# Altium footprint library 3.10-变压器.PcbLib: 33 footprints (part 2 of 3)
Each footprint in its own frame and in the unit in brackets; x right, y up, seen from the top. Pads: shape width x height; smd on the part's side, far side on the other; paste and mask are expansions set on the pad; w line width, h text height; cw(c..) or ccw(c..) is an arc to the next point about the centre after c.
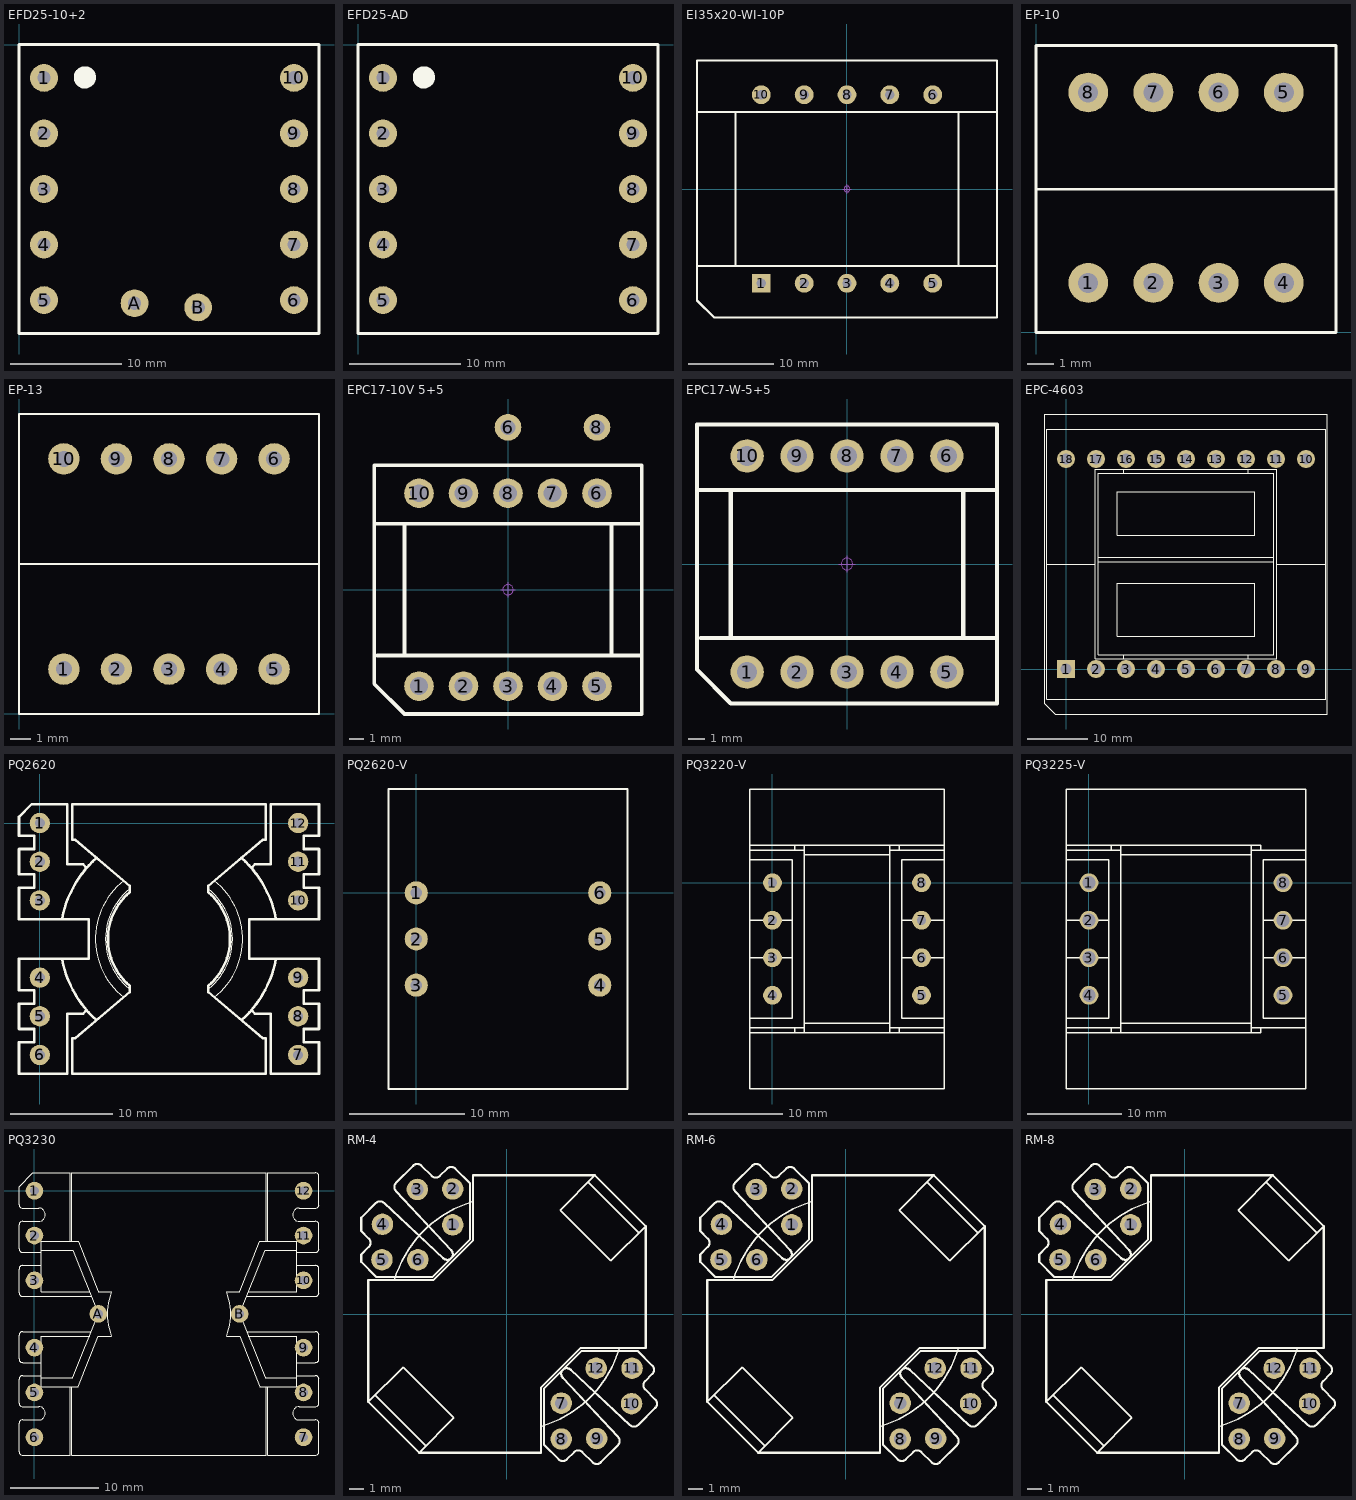
[diagram p1: the footprints below, top view; thin cyan lines are the x and y axes]

## EFD25-10+2 [mm]
pads (12):
  round 2.5 hole 1.2: 1(2.25,-3) 2(2.25,-8) 3(2.25,-13) 4(2.25,-18) 5(2.25,-23) 6(24.75,-23) 7(24.75,-18) 8(24.75,-13) 9(24.75,-8) 10(24.75,-3) A(10.4,-23.278) B(16.124,-23.66)
Top Overlay:
  circle w1: c5.927,-2.955 r0.5
  lines w0.3: 0,-26 0,0 27,0 27,-26 0,-26
3D body: height 12.9, standoff -3.5, extent 0.066,-26.59 26.934,0.59

## EFD25-AD [mm]
pads (10):
  round 2.5 hole 1.2: 1(2.25,-3) 2(2.25,-8) 3(2.25,-13) 4(2.25,-18) 5(2.25,-23) 6(24.75,-23) 7(24.75,-18) 8(24.75,-13) 9(24.75,-8) 10(24.75,-3)
Top Overlay:
  circle w1: c5.927,-2.955 r0.5
  lines w0.3: 0,-26 0,0 27,0 27,-26 0,-26
3D body: height 12.9, standoff -3.5, extent 0.066,-26.59 26.934,0.59

## EI35x20-WI-10P [mm] "长：35mm，宽：30mm，高：33mm  淘宝ID:黄晶宝石"
pads (10):
  rect 2.2x2.2 hole 1.1: 1(-10,-11)
  round 2.2 hole 1.1: 2(-5,-11) 3(0,-11) 4(5,-11) 5(10,-11) 6(10,11) 7(5,11) 8(0,11) 9(-5,11) 10(-10,11)
Top Overlay:
  lines w0.254: -17.5,-9 17.5,-9 ; -17.5,9 17.5,9 ; -13,-9 -13,9 ; 13,-9 13,9 ; -17.5,-13 -15.5,-15 17.5,-15 17.5,15 -17.5,15 -17.5,-13
Mechanical 15:
  circle w0.05: c0,0 r0.35
  lines w0.05: -0.5,0 0.5,0 ; 0,-0.5 0,0.5
3D body: height 33.55, standoff -2.95, extent -17.5,-15 17.5,15

## EP-10 [mil]
pads (8):
  round 60 hole 30: 1(78.74,74.8) 2(177.17,74.8) 3(275.59,74.8) 4(374.02,74.8) 5(374.02,362.2) 6(275.59,362.2) 7(177.17,362.2) 8(78.74,362.2)
Top Overlay:
  lines w3.94: 0,216.14 452.76,216.14 ; 0,0 452.76,0 452.76,433.07 0,433.07 0,0
3D body: height 441.63, standoff -160.73, extent 0,0 452.75,433.07

## EP-13 [mil] "淘宝ID:黄晶宝石   店铺网址:https://shop463601444.taobao.com"
pads (10):
  round 60 hole 30: 1(85.43,85.43) 2(185.43,85.43) 3(285.43,85.43) 4(385.43,85.43) 5(485.43,85.43) 6(485.43,485.43) 7(385.43,485.43) 8(285.43,485.43) 9(185.43,485.43) 10(85.43,485.43)
Top Overlay:
  lines w3.94: 0,285.43 570.87,285.43 ; 0,0 570.87,0 570.87,570.87 0,570.87 0,0
3D body: height 488.19, standoff -157.48, extent 29.49,29.49 541.38,541.38

## EPC17-10V 5+5 [mm] "磁芯17mm，高10mm，脚距3mm，  淘宝ID:黄晶宝石"
pads (12):
  round 2 hole 1.2: 1(-6,-6.5) 2(-3,-6.5) 3(0,-6.5) 4(3,-6.5) 5(6,-6.5) 6(6,6.5) 7(3,6.5) 8(0,6.5) 9(-3,6.5) 10(-6,6.5)
  round 1.8 hole 1: 6(0,10.945) 8(6,10.945)
Top Overlay:
  lines w0.254: -9.017,4.445 9.017,4.445 ; -8.794,-4.445 9.017,-4.445 ; -6.985,-4.445 -6.985,4.445 ; 6.985,-4.445 6.985,4.445 ; -9.017,-6.35 -6.985,-8.382 9.017,-8.382 9.017,8.382 -9.017,8.382 -9.017,-6.35
Mechanical 15:
  circle w0.05: c0,0 r0.35
  lines w0.05: -0.5,0 0.5,0 ; 0,-0.5 0,0.5
3D body: height 9.75, standoff -3.15, extent -8.75,-8.1 8.75,8.1

## EPC17-W-5+5 [mm] "磁芯17mm，高10mm，脚距3mm， 淘宝ID:黄晶宝石"
pads (10):
  round 2 hole 1.2: 1(-6,-6.5) 2(-3,-6.5) 3(0,-6.5) 4(3,-6.5) 5(6,-6.5) 6(6,6.5) 7(3,6.5) 8(0,6.5) 9(-3,6.5) 10(-6,6.5)
Top Overlay:
  lines w0.254: -9.017,4.445 9.017,4.445 ; -8.794,-4.445 9.017,-4.445 ; -6.985,-4.445 -6.985,4.445 ; 6.985,-4.445 6.985,4.445 ; -9.017,-6.35 -9.017,8.382 9.017,8.382 9.017,-8.382 -6.985,-8.382 -9.017,-6.35
Mechanical 15:
  circle w0.05: c0,0 r0.35
  lines w0.05: -0.5,0 0.5,0 ; 0,-0.5 0,0.5
3D body: height 9.75, standoff -3.15, extent -8.75,-8.1 8.75,8.1

## EPC-4603 [mm] "联系卖家 免费查找封装"
pads (18):
  rect 3x3 hole 1.8: 1(0,0)
  round 3 hole 1.8: 2(5,0) 3(10,0) 4(15,0) 5(20,0) 6(25,0) 7(30,0) 8(35,0) 9(40,0) 10(40,35) 11(35,35) 12(30,35) 13(25,35) 14(20,35) 15(15,35) 16(10,35) 17(5,35) 18(0,35)
Top Overlay:
  lines w0.1: 5.354,17.85 34.649,17.85 ; 5.354,18.65 34.649,18.65 ; 9.6,1.7 9.6,2.346 ; 9.6,32.654 9.6,33.3 ; 30.4,1.7 30.4,2.341 ; 30.4,32.659 30.4,33.3 ; -3.25,17.5 4.9,17.5 ; -3.25,17.5 -3.25,-5 43.25,-5 43.25,17.5 ; -3.25,17.5 -3.25,40 43.25,40 43.25,17.5 ; 4.9,17.5 4.9,1.7 35.1,1.7 35.1,17.5 ; 4.9,17.5 4.9,33.3 35.1,33.3 35.1,17.5 ; 35.1,17.5 43.25,17.5 ; -3.5,-5.819 -1.819,-7.5 43.5,-7.5 43.5,42.5 -3.5,42.5 -3.5,-5.819 ; 5.35,2.35 34.65,2.35 34.65,32.65 5.35,32.65 5.35,2.35 ; 8.5,5.5 31.5,5.5 31.5,14.25 8.5,14.25 8.5,5.5 ; 8.5,22.25 31.5,22.25 31.5,29.5 8.5,29.5 8.5,22.25
3D body: height 29.5, standoff -5, extent -3.5,-7.5 43.5,42.5

## PQ2620 [mm]
height 20.5
pads (12):
  round 2 hole 1: 1(0,0) 2(0,-3.8) 3(0,-7.6) 4(0,-15.2) 5(0,-19) 6(0,-22.8) 7(25.4,-22.8) 8(25.4,-19) 9(25.4,-15.2) 10(25.4,-7.6) 11(25.4,-3.8) 12(25.4,0)
Top Overlay:
  lines w0.1: 8.241,-17.117 cw(c12.7,-11.4) 8.249,-5.677 ; 8.838,-16.314 cw(c12.7,-11.4) 8.845,-6.48 ; 16.555,-6.48 cw(c12.7,-11.4) 16.562,-16.314 ; 17.151,-5.677 cw(c12.7,-11.4) 17.159,-17.117
  lines w0.254: 2.192,-13.418 ccw(c12.7,-11.4) 5.563,-19.372 ; 2.192,-9.382 cw(c12.7,-11.4) 5.578,-3.414 ; 4.609,-18.403 4.262,-18.75 2.7,-18.75 2.7,-24.65 -2.05,-24.65 -2.05,-21.55 -0.55,-21.55 -0.55,-20.25 -2.05,-20.25 -2.05,-17.75 -0.55,-17.75 -0.55,-16.45 -2.05,-16.45 -2.05,-13.35 4.8,-13.35 4.8,-9.45 -2.05,-9.45 -2.05,-6.35 -0.55,-6.35 -0.55,-5.05 -2.05,-5.05 -2.05,-2.55 -0.55,-2.55 -0.55,-1.25 -2.05,-1.25 -2.05,0.602 -0.802,1.85 2.7,1.85 2.7,-4.05 4.262,-4.05 4.609,-4.397 ; 8.843,-15.997 8.843,-16.617 3.5,-21.15 3.2,-21.15 3.2,-24.65 22.2,-24.65 22.2,-21.15 21.9,-21.15 16.556,-16.617 16.556,-15.997 ; 8.843,-15.996 cw(c12.7,-11.4) 8.843,-6.804 8.843,-6.183 ; 8.844,-6.183 3.5,-1.65 3.2,-1.65 3.2,1.85 22.2,1.85 22.2,-1.65 21.9,-1.65 16.557,-6.182 16.557,-6.803 cw(c12.7,-11.4) 16.557,-15.996 ; 19.822,-3.414 cw(c12.7,-11.4) 23.208,-9.382 ; 19.837,-19.372 ccw(c12.7,-11.4) 23.208,-13.418 ; 20.791,-18.403 21.138,-18.75 22.7,-18.75 22.7,-24.65 27.45,-24.65 27.45,-21.55 25.95,-21.55 25.95,-20.25 27.45,-20.25 27.45,-17.75 25.95,-17.75 25.95,-16.45 27.45,-16.45 27.45,-13.35 20.6,-13.35 20.6,-9.45 27.45,-9.45 27.45,-6.35 25.95,-6.35 25.95,-5.05 27.45,-5.05 27.45,-2.55 25.95,-2.55 25.95,-1.25 27.45,-1.25 27.45,1.85 22.7,1.85 22.7,-4.05 21.138,-4.05 20.791,-4.397
3D body: height 25.1, standoff -4.4, extent -1.41,-24.507 27.19,1.693

## PQ2620-V [mm]
height 20.5
pads (6):
  round 2 hole 1: 1(0,0) 2(0,-4) 3(0,-8) 4(15.9,-8) 5(15.9,-4) 6(15.9,0)
Top Overlay:
  lines w0.15: -2.4,-17 -2.4,9 18.3,9 18.3,-17 -2.4,-17
3D body: height 26.9, standoff -4, extent -2.504,-16.937 18.296,9.063

## PQ3220-V [mm]
height 20.5
pads (8):
  round 2 hole 1: 1(0,0) 2(0,-4) 3(0,-8) 4(0,-12) 5(15.9,-12) 6(15.9,-8) 7(15.9,-4) 8(15.9,0)
Top Overlay:
  lines w0.15: -2.4,-16 18.3,-16 ; -2.4,-14.45 2.1,-14.45 2.1,2.45 -2.4,2.45 ; -2.4,-8 2.102,-8 ; -2.4,-4 2.1,-4 ; -2.4,4 18.3,4 ; -2.397,-15.45 3.4,-15.45 ; -2.397,3.45 3.4,3.45 ; 2.4,-16 2.4,-15.45 ; 2.4,3.45 2.4,4 ; 3.4,-16 3.4,-15.45 ; 3.4,-15 12.5,-15 ; 3.4,3 12.5,3 ; 3.4,4 3.4,3.45 ; 12.5,-16 12.5,-15.45 ; 12.5,4 12.5,3.45 ; 13.5,-16 13.5,-15.45 ; 13.5,3.45 13.5,4 ; 13.798,-8 18.3,-8 ; 13.8,-4 18.3,-4 ; 18.297,-15.45 12.5,-15.45 ; 18.297,3.45 12.5,3.45 ; 18.3,-14.45 13.8,-14.45 13.8,2.45 18.3,2.45 ; 3.4,-15.45 3.4,3.45 ; 12.5,-15.45 12.5,3.45 ; -2.4,-22 -2.4,10 18.3,10 18.3,-22 -2.4,-22
3D body: height 29.88, standoff -3.82, extent -2.079,-21.82 17.921,9.88

## PQ3225-V [mm] "淘宝ID:黄晶宝石   店铺网址:https://shop463601444.taobao.com"
height 20.5
pads (8):
  round 2 hole 1.4: 1(0,0) 2(0,-4) 3(0,-8) 4(0,-12) 5(20.7,-12) 6(20.7,-8) 7(20.7,-4) 8(20.7,0)
Top Overlay:
  lines w0.15: -2.4,-16 18.3,-16 18.3,-15.45 ; -2.4,-14.45 2.1,-14.45 2.1,2.45 -2.4,2.45 ; -2.4,-8 2.102,-8 ; -2.4,-4 2.1,-4 ; -2.4,4 18.3,4 18.3,3.45 ; -2.397,-15.45 3.4,-15.45 ; -2.397,3.45 3.4,3.45 ; 2.4,-16 2.4,-15.45 ; 2.4,3.45 2.4,4 ; 3.4,-16 3.4,-15.45 ; 3.4,-15 17.295,-15 ; 3.4,3 17.298,3 ; 3.4,4 3.4,3.45 ; 17.3,-16 17.3,-15.45 ; 17.3,4 17.3,3.45 ; 18.598,-8 23.1,-8 ; 18.6,-4 23.1,-4 ; 23.097,-15.45 17.3,-15.45 ; 23.097,3.45 17.3,3.45 ; 23.1,-14.45 18.6,-14.45 18.6,2.45 23.1,2.45 ; 3.4,-15.45 3.4,3.45 ; 17.3,-15.45 17.3,3.45 ; -2.4,-22 -2.4,10 23.1,10 23.1,-22 -2.4,-22
3D body: height 29.8, standoff -3.82, extent -2.15,-21.85 22.85,9.85

## PQ3230 [mm]
height 20.5
pads (14):
  round 2 hole 1: 1(0,0) 2(0,-5.08) 3(0,-10.16) 4(0,-17.78) 5(0,-22.86) 6(0,-27.94) 7(30.5,-27.94) 8(30.5,-22.86) 9(30.5,-17.78) 10(30.5,-10.16) 11(30.5,-5.08) 12(30.5,0) A(7.25,-13.959) B(23.25,-13.959)
Top Overlay:
  lines w0.1: 4.05,-22.22 4.05,-29.97 -1.34,-29.97 cw(c-1.34,-29.56) -1.75,-29.56 -1.75,-26.38 cw(c-1.34,-26.38) -1.34,-25.97 0.5,-25.97 ccw(c0.5,-25.22) 0.5,-24.47 -1.34,-24.47 cw(c-1.34,-24.06) -1.75,-24.06 -1.75,-21.38 cw(c-1.34,-21.38) -1.34,-20.97 0.749,-20.97 0.749,-19.47 -1.34,-19.47 cw(c-1.34,-19.06) -1.75,-19.06 -1.75,-16.38 cw(c-1.34,-16.38) -1.34,-15.97 6.451,-15.97 ; 4.05,-5.72 4.05,2.03 -0.195,2.03 -1.75,0.475 -1.75,-1.56 ccw(c-1.34,-1.56) -1.34,-1.97 0.5,-1.97 cw(c0.5,-2.72) 0.5,-3.47 -1.34,-3.47 ccw(c-1.34,-3.88) -1.75,-3.88 -1.75,-6.56 ccw(c-1.34,-6.56) -1.34,-6.97 0.749,-6.97 0.749,-8.47 -1.34,-8.47 ccw(c-1.34,-8.88) -1.75,-8.88 -1.75,-11.56 ccw(c-1.34,-11.56) -1.34,-11.97 6.451,-11.97 ; 4.25,-22.22 4.25,-29.97 26.25,-29.97 26.25,-22.22 ; 4.25,-5.72 4.25,2.03 26.25,2.03 26.25,-5.72 ; 6.25,-16.47 0.75,-16.47 0.75,-21.22 ; 6.25,-11.47 0.75,-11.47 0.75,-6.72 ; 7.25,-13.981 4.341,-21.22 0.75,-21.22 ; 7.25,-13.959 4.341,-6.72 0.75,-6.72 ; 8.699,-16.47 7.25,-16.47 4.939,-22.22 0.75,-22.22 0.75,-21.22 ; 8.699,-11.47 7.25,-11.47 4.939,-5.72 0.75,-5.72 0.75,-6.72 ; 8.71,-16.466 cw(c15.25,-13.97) 8.71,-11.474 ; 21.79,-16.466 ccw(c15.25,-13.97) 21.79,-11.474 ; 21.801,-16.47 23.25,-16.47 25.561,-22.22 29.75,-22.22 29.75,-21.22 ; 21.801,-11.47 23.25,-11.47 25.561,-5.72 29.75,-5.72 29.75,-6.72 ; 23.25,-13.981 26.159,-21.22 29.75,-21.22 ; 23.25,-13.959 26.159,-6.72 29.75,-6.72 ; 24.049,-15.97 31.84,-15.97 cw(c31.84,-16.38) 32.25,-16.38 32.25,-19.06 cw(c31.84,-19.06) 31.84,-19.47 29.751,-19.47 29.751,-20.97 31.84,-20.97 cw(c31.84,-21.38) 32.25,-21.38 32.25,-24.06 cw(c31.84,-24.06) 31.84,-24.47 30,-24.47 ccw(c30,-25.22) 30,-25.97 31.84,-25.97 cw(c31.84,-26.38) 32.25,-26.38 32.25,-29.56 cw(c31.84,-29.56) 31.84,-29.97 26.45,-29.97 26.45,-22.22 ; 24.049,-11.97 31.84,-11.97 ccw(c31.84,-11.56) 32.25,-11.56 32.25,-8.88 ccw(c31.84,-8.88) 31.84,-8.47 29.751,-8.47 29.751,-6.97 31.84,-6.97 ccw(c31.84,-6.56) 32.25,-6.56 32.25,-3.88 ccw(c31.84,-3.88) 31.84,-3.47 30,-3.47 cw(c30,-2.72) 30,-1.97 31.84,-1.97 ccw(c31.84,-1.56) 32.25,-1.56 32.25,1.62 ccw(c31.84,1.62) 31.84,2.03 26.45,2.03 26.45,-5.72 ; 24.25,-16.47 29.75,-16.47 29.75,-21.22 ; 24.25,-11.47 29.75,-11.47 29.75,-6.72
3D body: height 30.2, standoff -4.7, extent -1.671,-30.046 32.329,1.953

## RM-4 [mil]
pads (12):
  round 60 hole 35.43: 1(-151.72,249.16) 2(-151.72,349.38) 3(-250.55,347.99) 4(-347.99,250.55) 5(-349.38,151.72) 6(-249.16,151.72) 7(151.72,-249.16) 8(151.72,-349.38) 9(250.55,-347.99) 10(347.99,-250.55) 11(349.38,-151.72) 12(249.16,-151.72)
Top Overlay:
  lines w3.94: -387.66,-245.68 -290.22,-148.24 -148.24,-290.22 -245.68,-387.66 ; -368.59,-226.61 -226.61,-368.59 ; -314.81,94.69 cw(c0,0) -94.74,314.79 ; 94.69,-314.81 ccw(c0,0) 314.79,-94.73 ; 226.61,368.59 368.59,226.61 ; 245.68,387.66 148.24,290.22 290.22,148.24 387.66,245.68
  lines w5.91: -407.35,145.67 -364.69,103 -208.79,103 -103,208.79 ; -407.35,146.42 -407.34,166.14 -385.93,187.55 ccw(c-397.37,198.99) -385.93,210.43 -407.34,231.84 ; -407.34,231.96 -407.34,269.03 -366.33,310.04 cw(c-354.89,298.6) -343.45,310.04 ; -343.1,310.41 -178.4,155.77 ; -310.41,343.1 -155.77,178.4 ; -310.1,366.39 -262.05,414.44 cw(c-250.61,403) -239.16,414.44 -210.66,385.93 ; -310.04,343.45 cw(c-298.6,354.89) -310.04,366.33 ; -210.43,385.93 ccw(c-198.99,397.37) -187.55,385.93 -167.4,406.09 cw(c-155.95,394.64) -144.51,406.09 -103.37,364.94 ccw(c-103.31,365) -103.25,364.94 -103.25,208.93 ; -178.22,155.95 ccw(c-167.09,167.09) -155.95,178.22 ; 103,-364.69 103,-208.79 208.79,-103 ; 103.37,-364.94 144.51,-406.09 ccw(c155.95,-394.64) 167.39,-406.09 187.55,-385.93 cw(c198.99,-397.37) 210.43,-385.93 ; 155.77,-178.4 310.41,-343.1 ; 155.95,-178.22 cw(c167.09,-167.09) 178.22,-155.95 ; 178.4,-155.77 343.1,-310.41 ; 208.93,-103.25 364.94,-103.25 ; 210.66,-385.93 239.16,-414.44 ccw(c250.61,-403) 262.05,-414.44 310.1,-366.39 ; 310.04,-366.33 ccw(c298.6,-354.89) 310.04,-343.45 ; 343.45,-310.04 ccw(c354.89,-298.6) 366.33,-310.04 ; 364.94,-103.37 406.09,-144.51 cw(c394.64,-155.95) 406.09,-167.39 385.93,-187.55 ccw(c397.37,-198.99) 385.93,-210.43 ; 366.39,-310.1 414.44,-262.05 ccw(c403,-250.61) 414.44,-239.16 385.93,-210.66 ; -387.66,-245.68 -387.66,94.65 -206.01,94.65 -94.65,206.01 -94.65,387.66 245.68,387.66 387.66,245.68 387.66,-94.65 206.01,-94.65 94.65,-206.01 94.65,-387.66 -245.68,-387.66 -387.66,-245.68
3D body: height 647.05, standoff -116.73, extent -417.83,-417.83 417.83,417.83

## RM-6 [mil]
pads (12):
  round 60 hole 35.43: 1(-151.72,249.16) 2(-151.72,349.38) 3(-250.55,347.99) 4(-347.99,250.55) 5(-349.38,151.72) 6(-249.16,151.72) 7(151.72,-249.16) 8(151.72,-349.38) 9(250.55,-347.99) 10(347.99,-250.55) 11(349.38,-151.72) 12(249.16,-151.72)
Top Overlay:
  lines w3.94: -387.66,-245.68 -290.22,-148.24 -148.24,-290.22 -245.68,-387.66 ; -368.59,-226.61 -226.61,-368.59 ; -314.81,94.69 cw(c0,0) -94.74,314.79 ; 94.69,-314.81 ccw(c0,0) 314.79,-94.73 ; 226.61,368.59 368.59,226.61 ; 245.68,387.66 148.24,290.22 290.22,148.24 387.66,245.68
  lines w5.91: -407.35,145.67 -364.69,103 -208.79,103 -103,208.79 ; -407.35,146.42 -407.34,166.14 -385.93,187.55 ccw(c-397.37,198.99) -385.93,210.43 -407.34,231.84 ; -407.34,231.96 -407.34,269.03 -366.33,310.04 cw(c-354.89,298.6) -343.45,310.04 ; -343.1,310.41 -178.4,155.77 ; -310.41,343.1 -155.77,178.4 ; -310.1,366.39 -262.05,414.44 cw(c-250.61,403) -239.16,414.44 -210.66,385.93 ; -310.04,343.45 cw(c-298.6,354.89) -310.04,366.33 ; -210.43,385.93 ccw(c-198.99,397.37) -187.55,385.93 -167.4,406.09 cw(c-155.95,394.64) -144.51,406.09 -103.37,364.94 ccw(c-103.31,365) -103.25,364.94 -103.25,208.93 ; -178.22,155.95 ccw(c-167.09,167.09) -155.95,178.22 ; 103,-364.69 103,-208.79 208.79,-103 ; 103.37,-364.94 144.51,-406.09 ccw(c155.95,-394.64) 167.39,-406.09 187.55,-385.93 cw(c198.99,-397.37) 210.43,-385.93 ; 155.77,-178.4 310.41,-343.1 ; 155.95,-178.22 cw(c167.09,-167.09) 178.22,-155.95 ; 178.4,-155.77 343.1,-310.41 ; 208.93,-103.25 364.94,-103.25 ; 210.66,-385.93 239.16,-414.44 ccw(c250.61,-403) 262.05,-414.44 310.1,-366.39 ; 310.04,-366.33 ccw(c298.6,-354.89) 310.04,-343.45 ; 343.45,-310.04 ccw(c354.89,-298.6) 366.33,-310.04 ; 364.94,-103.37 406.09,-144.51 cw(c394.64,-155.95) 406.09,-167.39 385.93,-187.55 ccw(c397.37,-198.99) 385.93,-210.43 ; 366.39,-310.1 414.44,-262.05 ccw(c403,-250.61) 414.44,-239.16 385.93,-210.66 ; -387.66,-245.68 -245.68,-387.66 94.65,-387.66 94.65,-206.01 206.01,-94.65 387.66,-94.65 387.66,245.68 245.68,387.66 -94.65,387.66 -94.65,206.01 -206.01,94.65 -387.66,94.65 -387.66,-245.68
3D body: height 647.05, standoff -116.73, extent -417.83,-417.83 417.83,417.83

## RM-8 [mil]
pads (12):
  round 60 hole 35.43: 1(-151.72,249.16) 2(-151.72,349.38) 3(-250.55,347.99) 4(-347.99,250.55) 5(-349.38,151.72) 6(-249.16,151.72) 7(151.72,-249.16) 8(151.72,-349.38) 9(250.55,-347.99) 10(347.99,-250.55) 11(349.38,-151.72) 12(249.16,-151.72)
Top Overlay:
  lines w3.94: -387.66,-245.68 -290.22,-148.24 -148.24,-290.22 -245.68,-387.66 ; -368.59,-226.61 -226.61,-368.59 ; -314.81,94.69 cw(c0,0) -94.74,314.79 ; 94.69,-314.81 ccw(c0,0) 314.79,-94.73 ; 226.61,368.59 368.59,226.61 ; 245.68,387.66 148.24,290.22 290.22,148.24 387.66,245.68
  lines w5.91: -407.35,145.67 -364.69,103 -208.79,103 -103,208.79 ; -407.35,146.42 -407.34,166.14 -385.93,187.55 ccw(c-397.37,198.99) -385.93,210.43 -407.34,231.84 ; -407.34,231.96 -407.34,269.03 -366.33,310.04 cw(c-354.89,298.6) -343.45,310.04 ; -343.1,310.41 -178.4,155.77 ; -310.41,343.1 -155.77,178.4 ; -310.1,366.39 -262.05,414.44 cw(c-250.61,403) -239.16,414.44 -210.66,385.93 ; -310.04,343.45 cw(c-298.6,354.89) -310.04,366.33 ; -210.43,385.93 ccw(c-198.99,397.37) -187.55,385.93 -167.4,406.09 cw(c-155.95,394.64) -144.51,406.09 -103.37,364.94 ccw(c-103.31,365) -103.25,364.94 -103.25,208.93 ; -178.22,155.95 ccw(c-167.09,167.09) -155.95,178.22 ; 103,-364.69 103,-208.79 208.79,-103 ; 103.37,-364.94 144.51,-406.09 ccw(c155.95,-394.64) 167.39,-406.09 187.55,-385.93 cw(c198.99,-397.37) 210.43,-385.93 ; 155.77,-178.4 310.41,-343.1 ; 155.95,-178.22 cw(c167.09,-167.09) 178.22,-155.95 ; 178.4,-155.77 343.1,-310.41 ; 208.93,-103.25 364.94,-103.25 ; 210.66,-385.93 239.16,-414.44 ccw(c250.61,-403) 262.05,-414.44 310.1,-366.39 ; 310.04,-366.33 ccw(c298.6,-354.89) 310.04,-343.45 ; 343.45,-310.04 ccw(c354.89,-298.6) 366.33,-310.04 ; 364.94,-103.37 406.09,-144.51 cw(c394.64,-155.95) 406.09,-167.39 385.93,-187.55 ccw(c397.37,-198.99) 385.93,-210.43 ; 366.39,-310.1 414.44,-262.05 ccw(c403,-250.61) 414.44,-239.16 385.93,-210.66 ; -387.66,-245.68 -245.68,-387.66 94.65,-387.66 94.65,-206.01 206.01,-94.65 387.66,-94.65 387.66,245.68 245.68,387.66 -94.65,387.66 -94.65,206.01 -206.01,94.65 -387.66,94.65 -387.66,-245.68
3D body: height 647.05, standoff -116.73, extent -417.83,-417.83 417.83,417.83